# Altium footprint library THU.PcbLib: 477 footprints (part 12 of 30)
Each footprint in its own frame and in the unit in brackets; x right, y up, seen from the top. Pads: shape width x height; smd on the part's side, far side on the other; paste and mask are expansions set on the pad; w line width, h text height; cw(c..) or ccw(c..) is an arc to the next point about the centre after c.
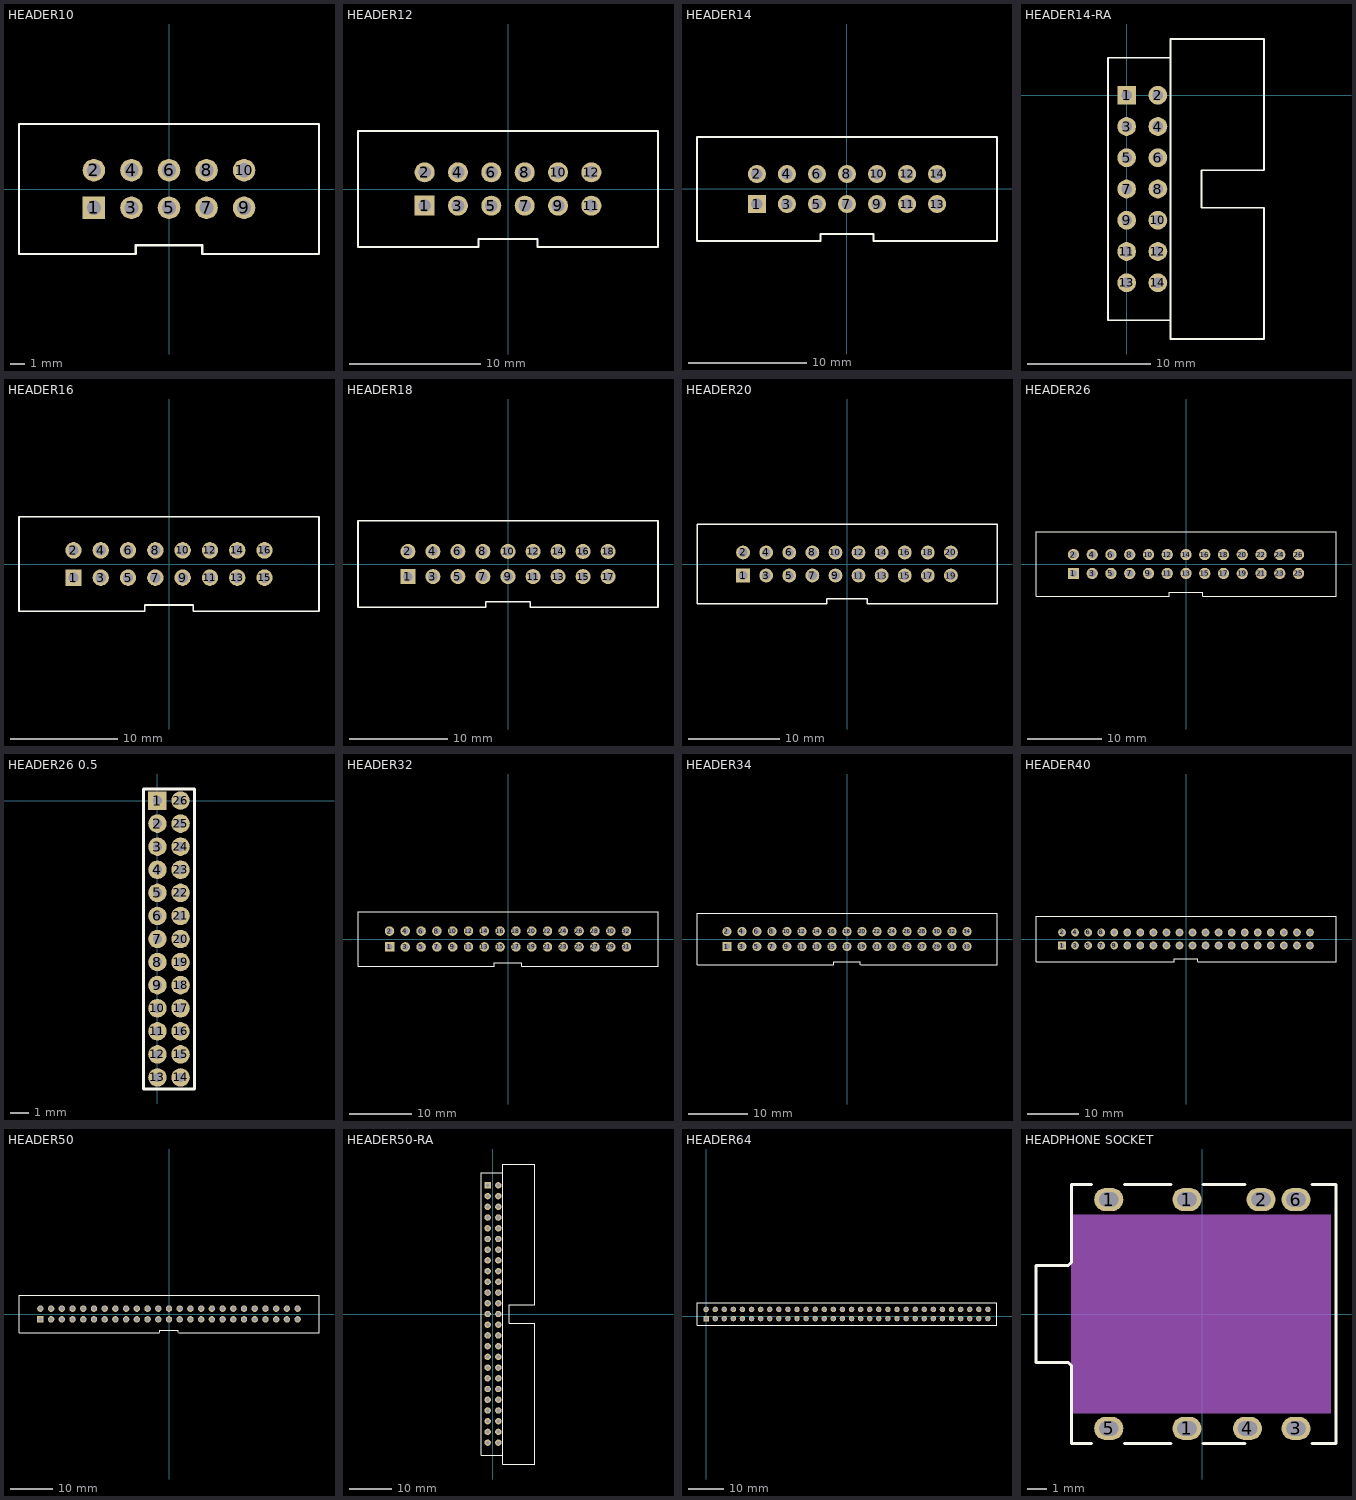
[diagram p11: the footprints below, top view; thin cyan lines are the x and y axes]

## HEADER10 [mil]
pads (10):
  rect 60x60 hole 38: 1(-200,-50)
  round 60 hole 38: 2(-200,50) 3(-100,-50) 4(-100,50) 5(0,-50) 6(0,50) 7(100,-50) 8(100,50) 9(200,-50) 10(200,50)
TopOverlay:
  lines w6: -88.58,-173.23 -399.61,-173.23 -399.61,173.23 399.61,173.23 399.61,-173.23 88.58,-173.23 ; -88.58,-171.81 -88.58,-150 88.58,-150 88.58,-171.81

## HEADER12 [mil]
pads (12):
  rect 60x60 hole 38: 1(-250,-50)
  round 60 hole 38: 2(-250,50) 3(-150,-50) 4(-150,50) 5(-50,-50) 6(-50,50) 7(50,-50) 8(50,50) 9(150,-50) 10(150,50) 11(250,-50) 12(250,50)
TopOverlay:
  lines w6: -88.58,-173.23 -449.61,-173.23 -449.61,173.23 449.61,173.23 449.61,-173.23 88.58,-173.23 ; -88.58,-171.81 -88.58,-150 88.58,-150 88.58,-171.81

## HEADER14 [mil]
pads (14):
  rect 60x60 hole 38: 1(-300,-50)
  round 60 hole 38: 2(-300,50) 3(-200,-50) 4(-200,50) 5(-100,-50) 6(-100,50) 7(0,-50) 8(0,50) 9(100,-50) 10(100,50) 11(200,-50) 12(200,50) 13(300,-50) 14(300,50)
TopOverlay:
  lines w6: -88.58,-173.23 -499.61,-173.23 -499.61,173.23 499.61,173.23 499.61,-173.23 88.58,-173.23 ; -88.58,-171.81 -88.58,-150 88.58,-150 88.58,-171.81

## HEADER14-RA [mil]
pads (14):
  rect 60x60 hole 34: 1(0,0)
  round 60 hole 34: 2(100,0) 3(0,-100) 4(100,-100) 5(0,-200) 6(100,-200) 7(0,-300) 8(100,-300) 9(0,-400) 10(100,-400) 11(0,-500) 12(100,-500) 13(0,-600) 14(100,-600)
TopOverlay:
  lines w6: 140,-720 -60,-720 -60,120 140,120 ; 140,-780 140,180 440,180 440,-240 240,-240 240,-360 440,-360 440,-780 140,-780

## HEADER16 [mil]
pads (16):
  rect 60x60 hole 38: 1(-350,-50)
  round 60 hole 38: 2(-350,50) 3(-250,-50) 4(-250,50) 5(-150,-50) 6(-150,50) 7(-50,-50) 8(-50,50) 9(50,-50) 10(50,50) 11(150,-50) 12(150,50) 13(250,-50) 14(250,50) 15(350,-50) 16(350,50)
TopOverlay:
  lines w6: -88.58,-173.23 -549.61,-173.23 -549.61,173.23 549.61,173.23 549.61,-173.23 88.58,-173.23 ; -88.58,-171.81 -88.58,-150 88.58,-150 88.58,-171.81
3D body "61201621621 (rev1).stp": height 359.25, standoff -117.13, extent -550.78,-174.2 550.79,187.02

## HEADER18 [mil]
pads (18):
  rect 60x60 hole 38: 1(-400,-50)
  round 60 hole 38: 2(-400,50) 3(-300,-50) 4(-300,50) 5(-200,-50) 6(-200,50) 7(-100,-50) 8(-100,50) 9(0,-50) 10(0,50) 11(100,-50) 12(100,50) 13(200,-50) 14(200,50) 15(300,-50) 16(300,50) 17(400,-50) 18(400,50)
TopOverlay:
  lines w6: -88.58,-173.23 -599.61,-173.23 -599.61,173.23 599.61,173.23 599.61,-173.23 88.58,-173.23 ; -88.58,-171.81 -88.58,-150 88.58,-150 88.58,-171.81

## HEADER20 [mil]
pads (20):
  rect 60x60 hole 38: 1(-450,-50)
  round 60 hole 38: 2(-450,50) 3(-350,-50) 4(-350,50) 5(-250,-50) 6(-250,50) 7(-150,-50) 8(-150,50) 9(-50,-50) 10(-50,50) 11(50,-50) 12(50,50) 13(150,-50) 14(150,50) 15(250,-50) 16(250,50) 17(350,-50) 18(350,50) 19(450,-50) 20(450,50)
TopOverlay:
  lines w6: -88.58,-173.23 -649.61,-173.23 -649.61,173.23 649.61,173.23 649.61,-173.23 88.58,-173.23 ; -88.58,-171.81 -88.58,-150 88.58,-150 88.58,-171.81

## HEADER26 [mil]
pads (26):
  rect 60x60 hole 38: 1(-600,-50)
  round 60 hole 38: 2(-600,50) 3(-500,-50) 4(-500,50) 5(-400,-50) 6(-400,50) 7(-300,-50) 8(-300,50) 9(-200,-50) 10(-200,50) 11(-100,-50) 12(-100,50) 13(0,-50) 14(0,50) 15(100,-50) 16(100,50) 17(200,-50) 18(200,50) 19(300,-50) 20(300,50) 21(400,-50) 22(400,50) 23(500,-50) 24(500,50) 25(600,-50) 26(600,50)
TopOverlay:
  lines w6: -88.58,-173.23 -799.61,-173.23 -799.61,173.23 799.61,173.23 799.61,-173.23 88.58,-173.23 ; -88.58,-171.81 -88.58,-150 88.58,-150 88.58,-171.81
3D body "61202621621 (rev1).stp": height 359.25, standoff -117.13, extent -800.78,-174.2 800.79,187.01

## HEADER26 0.5 [mil]
pads (26):
  rect 40x40 hole 20: 1(0,0)
  round 40 hole 20: 2(0,-50) 3(0,-100) 4(0,-150) 5(0,-200) 6(0,-250) 7(0,-300) 8(0,-350) 9(0,-400) 10(0,-450) 11(0,-500) 12(0,-550) 13(0,-600) 14(50,-600) 15(50,-550) 16(50,-500) 17(50,-450) 18(50,-400) 19(50,-350) 20(50,-300) 21(50,-250) 22(50,-200) 23(50,-150) 24(50,-100) 25(50,-50) 26(50,0)
TopOverlay:
  lines w6: 12.5,25 80,25 80,-625 -30,-625 -30,25 37.5,25

## HEADER32 [mil]
pads (32):
  rect 60x60 hole 38: 1(-750,-50)
  round 60 hole 38: 2(-750,50) 3(-650,-50) 4(-650,50) 5(-550,-50) 6(-550,50) 7(-450,-50) 8(-450,50) 9(-350,-50) 10(-350,50) 11(-250,-50) 12(-250,50) 13(-150,-50) 14(-150,50) 15(-50,-50) 16(-50,50) 17(50,-50) 18(50,50) 19(150,-50) 20(150,50) 21(250,-50) 22(250,50) 23(350,-50) 24(350,50) 25(450,-50) 26(450,50) 27(550,-50) 28(550,50) 29(650,-50) 30(650,50) 31(750,-50) 32(750,50)
TopOverlay:
  lines w6: -88.58,-173.23 -949.61,-173.23 -949.61,173.23 949.61,173.23 949.61,-173.23 88.58,-173.23 ; -88.58,-171.81 -88.58,-150 88.58,-150 88.58,-171.81

## HEADER34 [mil]
pads (34):
  rect 60x60 hole 38: 1(-800,-50)
  round 60 hole 38: 2(-800,50) 3(-700,-50) 4(-700,50) 5(-600,-50) 6(-600,50) 7(-500,-50) 8(-500,50) 9(-400,-50) 10(-400,50) 11(-300,-50) 12(-300,50) 13(-200,-50) 14(-200,50) 15(-100,-50) 16(-100,50) 17(0,-50) 18(0,50) 19(100,-50) 20(100,50) 21(200,-50) 22(200,50) 23(300,-50) 24(300,50) 25(400,-50) 26(400,50) 27(500,-50) 28(500,50) 29(600,-50) 30(600,50) 31(700,-50) 32(700,50) 33(800,-50) 34(800,50)
TopOverlay:
  lines w6: -90,-173.23 -999.61,-173.23 -999.61,173.23 999.61,173.23 999.61,-173.23 90,-173.23 ; -88.58,-171.81 -88.58,-150 88.58,-150 88.58,-171.81

## HEADER40 [mil]
pads (40):
  rect 60x60 hole 38: 1(-950,-50)
  round 60 hole 38: 2(-950,50) 3(-850,-50) 4(-850,50) 5(-750,-50) 6(-750,50) 7(-650,-50) 8(-650,50) 9(-550,-50) 10(-550,50) 11(-450,-50) 12(-450,50) 13(-350,-50) 14(-350,50) 15(-250,-50) 16(-250,50) 17(-150,-50) 18(-150,50) 19(-50,-50) 20(-50,50) 21(50,-50) 22(50,50) 23(150,-50) 24(150,50) 25(250,-50) 26(250,50) 27(350,-50) 28(350,50) 29(450,-50) 30(450,50) 31(550,-50) 32(550,50) 33(650,-50) 34(650,50) 35(750,-50) 36(750,50) 37(850,-50) 38(850,50) 39(950,-50) 40(950,50)
TopOverlay:
  lines w6: -90,-173.23 -1149.61,-173.23 -1149.61,173.23 1149.61,173.23 1149.61,-173.23 90,-173.23 ; -88.58,-171.81 -88.58,-150 88.58,-150 88.58,-171.81

## HEADER50 [mil]
pads (50):
  rect 60x60 hole 38: 1(-1200,-50)
  round 60 hole 38: 2(-1200,50) 3(-1100,-50) 4(-1100,50) 5(-1000,-50) 6(-1000,50) 7(-900,-50) 8(-900,50) 9(-800,-50) 10(-800,50) 11(-700,-50) 12(-700,50) 13(-600,-50) 14(-600,50) 15(-500,-50) 16(-500,50) 17(-400,-50) 18(-400,50) 19(-300,-50) 20(-300,50) 21(-200,-50) 22(-200,50) 23(-100,-50) 24(-100,50) 25(0,-50) 26(0,50) 27(100,-50) 28(100,50) 29(200,-50) 30(200,50) 31(300,-50) 32(300,50) 33(400,-50) 34(400,50) 35(500,-50) 36(500,50) 37(600,-50) 38(600,50) 39(700,-50) 40(700,50) 41(800,-50) 42(800,50) 43(900,-50) 44(900,50) 45(1000,-50) 46(1000,50) 47(1100,-50) 48(1100,50) 49(1200,-50) 50(1200,50)
TopOverlay:
  lines w6: -90,-173.23 -1399.61,-173.23 -1399.61,173.23 0,173.23 1399.61,173.23 1399.61,-173.23 90,-173.23 ; -88.58,-171.81 -88.58,-150 88.58,-150 88.58,-171.81

## HEADER50-RA [mil] "50WAY IDC BOX HEADER RA"
height 354.33
pads (50):
  rect 60x60 hole 34: 1(-50,1200)
  round 60 hole 34: 2(50,1200) 3(-50,1100) 4(50,1100) 5(-50,1000) 6(50,1000) 7(-50,900) 8(50,900) 9(-50,800) 10(50,800) 11(-50,700) 12(50,700) 13(-50,600) 14(50,600) 15(-50,500) 16(50,500) 17(-50,400) 18(50,400) 19(-50,300) 20(50,300) 21(-50,200) 22(50,200) 23(-50,100) 24(50,100) 25(-50,0) 26(50,0) 27(-50,-100) 28(50,-100) 29(-50,-200) 30(50,-200) 31(-50,-300) 32(50,-300) 33(-50,-400) 34(50,-400) 35(-50,-500) 36(50,-500) 37(-50,-600) 38(50,-600) 39(-50,-700) 40(50,-700) 41(-50,-800) 42(50,-800) 43(-50,-900) 44(50,-900) 45(-50,-1000) 46(50,-1000) 47(-50,-1100) 48(50,-1100) 49(-50,-1200) 50(50,-1200)
TopOverlay:
  lines w6: 90,-1320 -110,-1320 -110,1320 90,1320 ; 90,-1399.61 90,1399.61 390,1399.61 390,88.58 171.81,88.58 150,88.58 150,-88.58 171.81,-88.58 390,-88.58 390,-1399.61 90,-1399.61

## HEADER64 [mil]
pads (64):
  rect 60x60 hole 38: 1(0,-25)
  round 60 hole 38: 2(0,75) 3(100,-25) 4(100,75) 5(200,-25) 6(200,75) 7(300,-25) 8(300,75) 9(400,-25) 10(400,75) 11(500,-25) 12(500,75) 13(600,-25) 14(600,75) 15(700,-25) 16(700,75) 17(800,-25) 18(800,75) 19(900,-25) 20(900,75) 21(1000,-25) 22(1000,75) 23(1100,-25) 24(1100,75) 25(1200,-25) 26(1200,75) 27(1300,-25) 28(1300,75) 29(1400,-25) 30(1400,75) 31(1500,-25) 32(1500,75) 33(1600,-25) 34(1600,75) 35(1700,-25) 36(1700,75) 37(1800,-25) 38(1800,75) 39(1900,-25) 40(1900,75) 41(2000,-25) 42(2000,75) 43(2100,-25) 44(2100,75) 45(2200,-25) 46(2200,75) 47(2300,-25) 48(2300,75) 49(2400,-25) 50(2400,75) 51(2500,-25) 52(2500,75) 53(2600,-25) 54(2600,75) 55(2700,-25) 56(2700,75) 57(2800,-25) 58(2800,75) 59(2900,-25) 60(2900,75) 61(3000,-25) 62(3000,75) 63(3100,-25) 64(3100,75)
TopOverlay:
  lines w6: -100,-100 -100,150 3200,150 3200,-100 -100,-100

## HEADPHONE SOCKET [mm] "SJ-3506-SMT MID MOUNT AUDIO JACK"
height 6
pads (8):
  oval 1.5x1.2 hole 0.762 slot 1 at 0 deg: 1(-4.825,5.9) 1(-0.795,-5.9) 1(-0.795,5.9) 2(3.025,5.9) 3(4.825,-5.9) 4(2.325,-5.9) 5(-4.825,-5.9) 6(4.825,5.9)
TopOverlay:
  lines w0.127: -7.239,-2.5 -6.917,-2.5 -6.75,-2.667 ; -7.239,2.5 -6.917,2.5 -6.75,2.667 ; -6.9,-2.517 -6.9,-2.5 ; -6.9,2.5 -6.9,2.517
  lines w0.152: -6.9,-2.517 -6.75,-2.667 -6.75,-6.675 -5.721,-6.675 ; -6.9,-2.5 -8.575,-2.5 -8.575,2.5 -6.9,2.5 ; -6.9,2.517 -6.75,2.667 -6.75,6.675 -5.721,6.675 ; -4.021,-6.675 -1.608,-6.675 ; -4.021,6.675 -1.608,6.675 ; 0.043,-6.675 2.202,-6.675 ; 0.043,6.675 2.202,6.675 ; 5.657,-6.675 6.625,-6.675 6.888,-6.675 6.888,-3.575 6.888,6.675 6.625,6.675 5.657,6.675
Mechanical4:
  pour cut-out: -6.75,5.125 6.625,5.125 6.625,-5.125 -6.75,-5.125